# Altium footprint library SparkFun-Retired.PCBLIB: 302 footprints (part 11 of 19)
Each footprint in its own frame and in the unit in brackets; x right, y up, seen from the top. Pads: shape width x height; smd on the part's side, far side on the other; paste and mask are expansions set on the pad; w line width, h text height; cw(c..) or ccw(c..) is an arc to the next point about the centre after c.
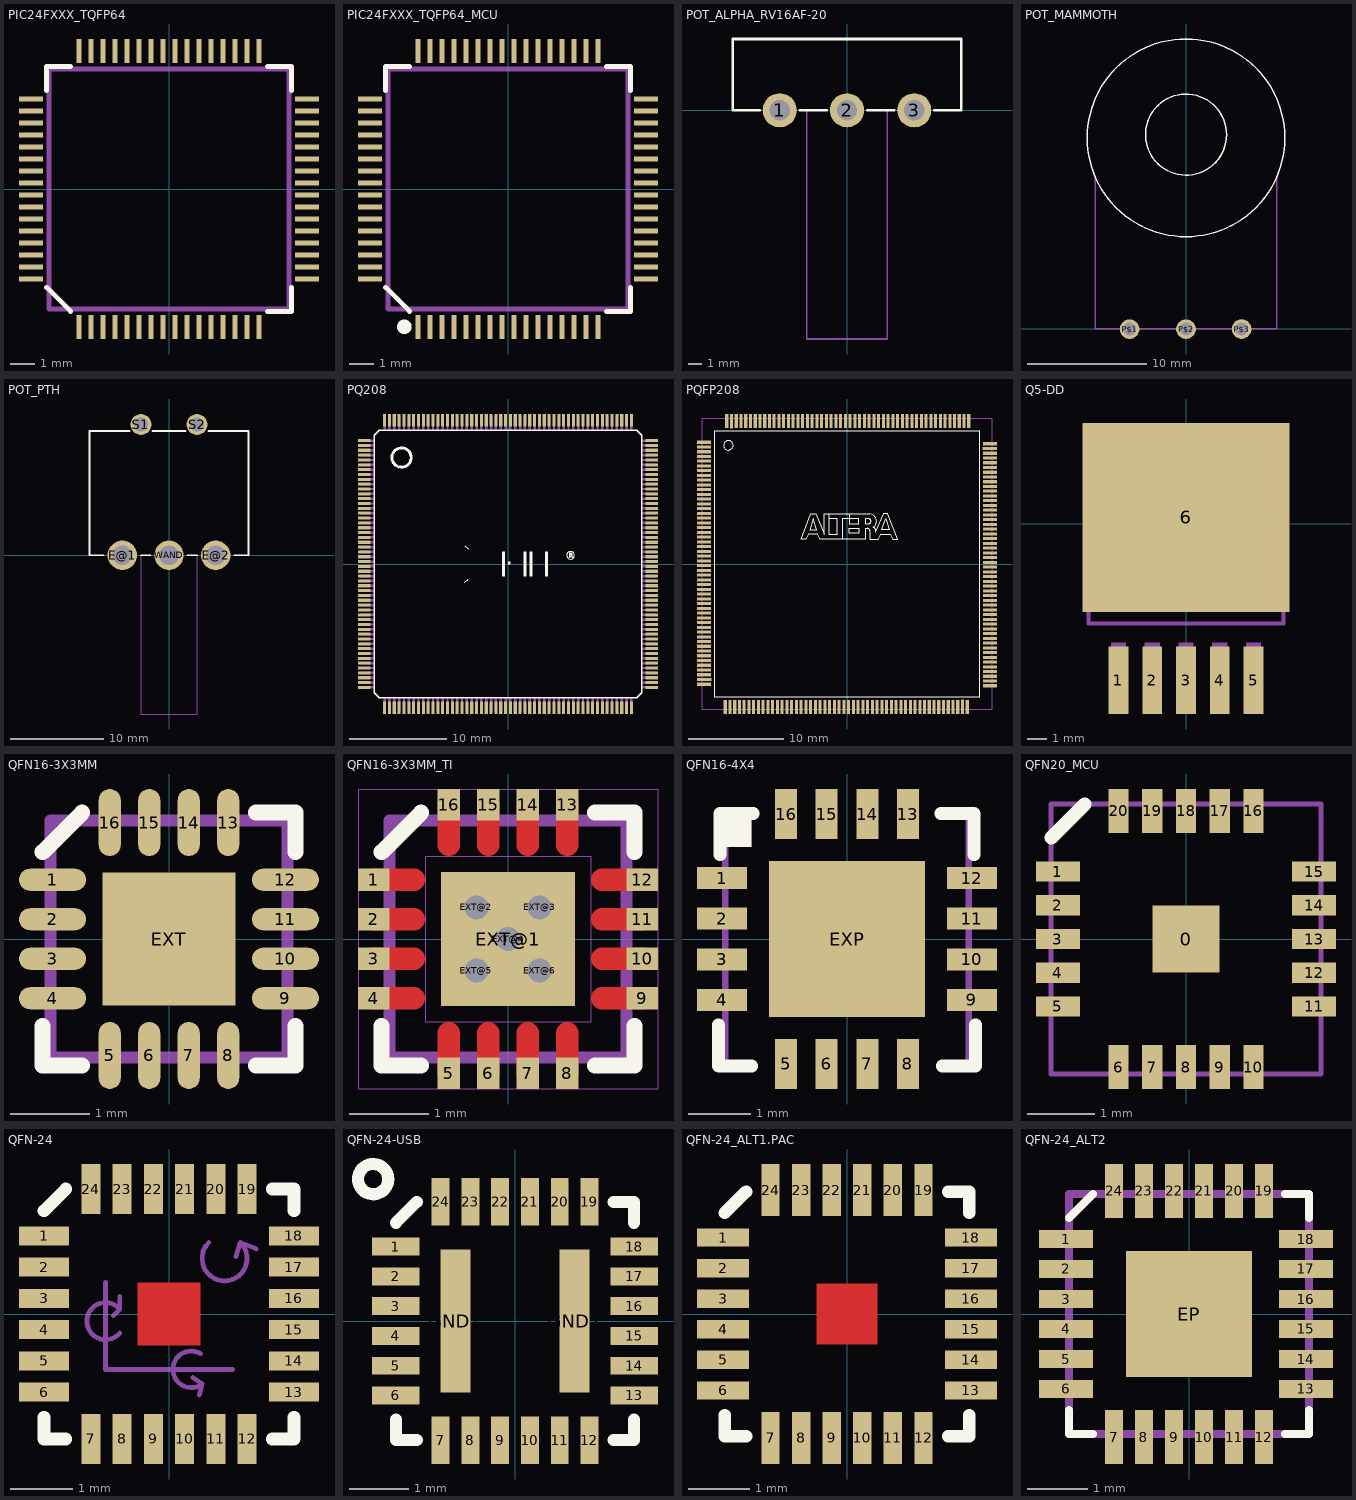
[diagram p10: the footprints below, top view; thin cyan lines are the x and y axes]

## PIC24FXXX_TQFP64 [mm]
pads (64):
  rect 0.22x1 smd: 1(-3.75,-5.75) 2(-3.25,-5.75) 3(-2.75,-5.75) 4(-2.25,-5.75) 5(-1.75,-5.75) 6(-1.25,-5.75) 7(-0.75,-5.75) 8(-0.25,-5.75) 9(0.25,-5.75) 10(0.75,-5.75) 11(1.25,-5.75) 12(1.75,-5.75) 13(2.25,-5.75) 14(2.75,-5.75) 15(3.25,-5.75) 16(3.75,-5.75) 33(3.75,5.75) 34(3.25,5.75) 35(2.75,5.75) 36(2.25,5.75) 37(1.75,5.75) 38(1.25,5.75) 39(0.75,5.75) 40(0.25,5.75) 41(-0.25,5.75) 42(-0.75,5.75) 43(-1.25,5.75) 44(-1.75,5.75) 45(-2.25,5.75) 46(-2.75,5.75) 47(-3.25,5.75) 48(-3.75,5.75)
  rect 1x0.22 smd: 17(5.75,-3.75) 18(5.75,-3.25) 19(5.75,-2.75) 20(5.75,-2.25) 21(5.75,-1.75) 22(5.75,-1.25) 23(5.75,-0.75) 24(5.75,-0.25) 25(5.75,0.25) 26(5.75,0.75) 27(5.75,1.25) 28(5.75,1.75) 29(5.75,2.25) 30(5.75,2.75) 31(5.75,3.25) 32(5.75,3.75) 49(-5.75,3.75) 50(-5.75,3.25) 51(-5.75,2.75) 52(-5.75,2.25) 53(-5.75,1.75) 54(-5.75,1.25) 55(-5.75,0.75) 56(-5.75,0.25) 57(-5.75,-0.25) 58(-5.75,-0.75) 59(-5.75,-1.25) 60(-5.75,-1.75) 61(-5.75,-2.25) 62(-5.75,-2.75) 63(-5.75,-3.25) 64(-5.75,-3.75)
Top Overlay:
  lines w0.203: -5.1,-4.1 -4.1,-5.1 ; -5.1,4.1 -5.1,5.1 -4.1,5.1 ; 4.1,-5.1 5.1,-5.1 5.1,-4.1 ; 4.1,5.1 5.1,5.1 5.1,4.1
Mechanical 16:
  lines w0.203: -5,-5 5,-5 5,5 -5,5 -5,-5

## PIC24FXXX_TQFP64_MCU [mm]
pads (64):
  rect 0.22x1 smd: 1(-3.75,-5.75) 2(-3.25,-5.75) 3(-2.75,-5.75) 4(-2.25,-5.75) 5(-1.75,-5.75) 6(-1.25,-5.75) 7(-0.75,-5.75) 8(-0.25,-5.75) 9(0.25,-5.75) 10(0.75,-5.75) 11(1.25,-5.75) 12(1.75,-5.75) 13(2.25,-5.75) 14(2.75,-5.75) 15(3.25,-5.75) 16(3.75,-5.75) 33(3.75,5.75) 34(3.25,5.75) 35(2.75,5.75) 36(2.25,5.75) 37(1.75,5.75) 38(1.25,5.75) 39(0.75,5.75) 40(0.25,5.75) 41(-0.25,5.75) 42(-0.75,5.75) 43(-1.25,5.75) 44(-1.75,5.75) 45(-2.25,5.75) 46(-2.75,5.75) 47(-3.25,5.75) 48(-3.75,5.75)
  rect 1x0.22 smd: 17(5.75,-3.75) 18(5.75,-3.25) 19(5.75,-2.75) 20(5.75,-2.25) 21(5.75,-1.75) 22(5.75,-1.25) 23(5.75,-0.75) 24(5.75,-0.25) 25(5.75,0.25) 26(5.75,0.75) 27(5.75,1.25) 28(5.75,1.75) 29(5.75,2.25) 30(5.75,2.75) 31(5.75,3.25) 32(5.75,3.75) 49(-5.75,3.75) 50(-5.75,3.25) 51(-5.75,2.75) 52(-5.75,2.25) 53(-5.75,1.75) 54(-5.75,1.25) 55(-5.75,0.75) 56(-5.75,0.25) 57(-5.75,-0.25) 58(-5.75,-0.75) 59(-5.75,-1.25) 60(-5.75,-1.75) 61(-5.75,-2.25) 62(-5.75,-2.75) 63(-5.75,-3.25) 64(-5.75,-3.75)
Top Overlay:
  circle w0.406: c-4.318,-5.74 r0.102
  lines w0.203: -5.1,-4.1 -4.1,-5.1 ; -5.1,4.1 -5.1,5.1 -4.1,5.1 ; 4.1,-5.1 5.1,-5.1 5.1,-4.1 ; 4.1,5.1 5.1,5.1 5.1,4.1
Mechanical 16:
  lines w0.203: -5,-5 5,-5 5,5 -5,5 -5,-5

## POT_ALPHA_RV16AF-20 [mm]
pads (3):
  round 2.54 hole 1.5: 1(-5,0) 2(0,0) 3(5,0)
Top Overlay:
  lines w0.203: -6.5,0 -8.5,0 -8.5,5.3 8.5,5.3 8.5,0 6.5,0 ; -3.5,0 -1.5,0 ; 1.5,0 3.5,0
Mechanical 16:
  lines w0.127: -3,0 -3,-17 3,-17 3,0

## POT_MAMMOTH [mm]
pads (3):
  round 1.65 hole 1.1: P$1(-4.73,-0.02) P$2(0,-0.02) P$3(4.67,-0.01)
Top Overlay:
  circle w0.127: c0,16.03 r8.293
  circle w0.127: c0,16.3 r3.4
Mechanical 16:
  lines w0.127: -7.62,0 0,0 7.62,0 ; -7.62,0.03 -7.62,12.75 ; 7.62,0.03 7.62,12.75

## POT_PTH [mm]
pads (5):
  round 3.15 hole 2.1: E@1(-5,0) E@2(5,0) WAND(0,0)
  round 2.25 hole 1.5: S1(-3,14) S2(3,14)
Top Overlay:
  lines w0.203: -7,0 -8.5,0 -8.5,13.3 -4.25,13.3 ; -3,0 -2,0 ; -1.75,13.3 1.75,13.3 ; 2,0 3,0 ; 4.25,13.3 8.5,13.3 8.5,0 7,0
Mechanical 16:
  lines w0.127: -3,0 -3,-17 3,-17 3,0

## PQ208 [mil]
pads (208):
  rect 51.18x12.6 smd: 1(-584.65,501.97) 2(-584.65,482.28) 3(-584.65,462.6) 4(-584.65,442.91) 5(-584.65,423.23) 6(-584.65,403.54) 7(-584.65,383.86) 8(-584.65,364.17) 9(-584.65,344.49) 10(-584.65,324.8) 11(-584.65,305.12) 12(-584.65,285.43) 13(-584.65,265.75) 14(-584.65,246.06) 15(-584.65,226.38) 16(-584.65,206.69) 17(-584.65,187.01) 18(-584.65,167.32) 19(-584.65,147.64) 20(-584.65,127.95) 21(-584.65,108.27) 22(-584.65,88.58) 23(-584.65,68.9) 24(-584.65,49.21) 25(-584.65,29.53) 26(-584.65,9.84) 27(-584.65,-9.84) 28(-584.65,-29.53) 29(-584.65,-49.21) 30(-584.65,-68.9) 31(-584.65,-88.58) 32(-584.65,-108.27) 33(-584.65,-127.95) 34(-584.65,-147.64) 35(-584.65,-167.32) 36(-584.65,-187.01) 37(-584.65,-206.69) 38(-584.65,-226.38) 39(-584.65,-246.06) 40(-584.65,-265.75) 41(-584.65,-285.43) 42(-584.65,-305.12) 43(-584.65,-324.8) 44(-584.65,-344.49) 45(-584.65,-364.17) 46(-584.65,-383.86) 47(-584.65,-403.54) 48(-584.65,-423.23) 49(-584.65,-442.91) 50(-584.65,-462.6) 51(-584.65,-482.28) 52(-584.65,-501.97) 105(584.65,-501.97) 106(584.65,-482.28) 107(584.65,-462.6) 108(584.65,-442.91) 109(584.65,-423.23) 110(584.65,-403.54) 111(584.65,-383.86) 112(584.65,-364.17) 113(584.65,-344.49) 114(584.65,-324.8) 115(584.65,-305.12) 116(584.65,-285.43) 117(584.65,-265.75) 118(584.65,-246.06) 119(584.65,-226.38) 120(584.65,-206.69) 121(584.65,-187.01) 122(584.65,-167.32) 123(584.65,-147.64) 124(584.65,-127.95) 125(584.65,-108.27) 126(584.65,-88.58) 127(584.65,-68.9) 128(584.65,-49.21) 129(584.65,-29.53) 130(584.65,-9.84) 131(584.65,9.84) 132(584.65,29.53) 133(584.65,49.21) 134(584.65,68.9) 135(584.65,88.58) 136(584.65,108.27) 137(584.65,127.95) 138(584.65,147.64) 139(584.65,167.32) 140(584.65,187.01) 141(584.65,206.69) 142(584.65,226.38) 143(584.65,246.06) 144(584.65,265.75) 145(584.65,285.43) 146(584.65,305.12) 147(584.65,324.8) 148(584.65,344.49) 149(584.65,364.17) 150(584.65,383.86) 151(584.65,403.54) 152(584.65,423.23) 153(584.65,442.91) 154(584.65,462.6) 155(584.65,482.28) 156(584.65,501.97)
  rect 12.6x51.18 smd: 53(-501.97,-584.65) 54(-482.28,-584.65) 55(-462.6,-584.65) 56(-442.91,-584.65) 57(-423.23,-584.65) 58(-403.54,-584.65) 59(-383.86,-584.65) 60(-364.17,-584.65) 61(-344.49,-584.65) 62(-324.8,-584.65) 63(-305.12,-584.65) 64(-285.43,-584.65) 65(-265.75,-584.65) 66(-246.06,-584.65) 67(-226.38,-584.65) 68(-206.69,-584.65) 69(-187.01,-584.65) 70(-167.32,-584.65) 71(-147.64,-584.65) 72(-127.95,-584.65) 73(-108.27,-584.65) 74(-88.58,-584.65) 75(-68.9,-584.65) 76(-49.21,-584.65) 77(-29.53,-584.65) 78(-9.84,-584.65) 79(9.84,-584.65) 80(29.53,-584.65) 81(49.21,-584.65) 82(68.9,-584.65) 83(88.58,-584.65) 84(108.27,-584.65) 85(127.95,-584.65) 86(147.64,-584.65) 87(167.32,-584.65) 88(187.01,-584.65) 89(206.69,-584.65) 90(226.38,-584.65) 91(246.06,-584.65) 92(265.75,-584.65) 93(285.43,-584.65) 94(305.12,-584.65) 95(324.8,-584.65) 96(344.49,-584.65) 97(364.17,-584.65) 98(383.86,-584.65) 99(403.54,-584.65) 100(423.23,-584.65) 101(442.91,-584.65) 102(462.6,-584.65) 103(482.28,-584.65) 104(501.97,-584.65) 157(501.97,584.65) 158(482.28,584.65) 159(462.6,584.65) 160(442.91,584.65) 161(423.23,584.65) 162(403.54,584.65) 163(383.86,584.65) 164(364.17,584.65) 165(344.49,584.65) 166(324.8,584.65) 167(305.12,584.65) 168(285.43,584.65) 169(265.75,584.65) 170(246.06,584.65) 171(226.38,584.65) 172(206.69,584.65) 173(187.01,584.65) 174(167.32,584.65) 175(147.64,584.65) 176(127.95,584.65) 177(108.27,584.65) 178(88.58,584.65) 179(68.9,584.65) 180(49.21,584.65) 181(29.53,584.65) 182(9.84,584.65) 183(-9.84,584.65) 184(-29.53,584.65) 185(-49.21,584.65) 186(-68.9,584.65) 187(-88.58,584.65) 188(-108.27,584.65) 189(-127.95,584.65) 190(-147.64,584.65) 191(-167.32,584.65) 192(-187.01,584.65) 193(-206.69,584.65) 194(-226.38,584.65) 195(-246.06,584.65) 196(-265.75,584.65) 197(-285.43,584.65) 198(-305.12,584.65) 199(-324.8,584.65) 200(-344.49,584.65) 201(-364.17,584.65) 202(-383.86,584.65) 203(-403.54,584.65) 204(-423.23,584.65) 205(-442.91,584.65) 206(-462.6,584.65) 207(-482.28,584.65) 208(-501.97,584.65)
Top Overlay:
  circle w12: c-433.07,433.07 r39.37
  circle w3.94: c254.59,35.3 r15.53
  rectangle: -25,-50 -12.5,50
  rectangle: 62.5,-50 75,50
  rectangle: 87.5,-50 100,50
  rectangle: 150,-50 162.5,50
  rectangle: 249,27 252,44
  rectangle: 251,42 258,44
  rectangle: 251,34 259,37
  region: 0,0 10,0 10,10 0,10
  region: 0,0 10,0 10,10 0,10
  region: 0,0 10,0 10,10 0,10
  region: 0,0 10,0 10,10 0,10
  region: 0,0 10,0 10,10 0,10
  region: 0,0 10,0 10,10 0,10
  region: 0,0 10,0 10,10 0,10
  region: 0,0 10,0 10,10 0,10
  region: 0,0 10,0 10,10 0,10
  region: 0,0 10,0 10,10 0,10
  lines w1.27: 256.11,37.06 ccw(c256.05,39.42) 255.99,41.78 252.43,41.78 252.43,37.08 256.11,37.08 ; 261.57,33.02 262.72,27.3 258.65,27.3 257.89,32.63 ccw(c256.25,32.5) 256.37,34.16 252.43,34.28 252.43,27.3 248.75,27.3 248.75,44.57 256.75,44.57 cw(c256.81,40.02) 258.53,35.8 cw(c258.18,32.37) 261.58,33.02
  lines w2.5: -175,-75 -162.5,-62.5 ; -175,75 -162.5,62.5
  lines w6: 544.09,520.87 544.09,514.96 ; 544.09,514.96 544.09,-524.41 524.41,-544.09 -524.41,-544.09 -544.09,-524.41 -544.09,524.41 -524.41,544.09 524.41,544.09 544.09,524.41 544.09,514.96
Top Paste:
  drawing of 208 lines, arcs and shapes, not listed
Mechanical 16:
  drawing of 208 lines, arcs and shapes, not listed

## PQFP208 [mm]
pads (208):
  rect 1.5x0.33 smd: 1(-15.05,12.83) 2(-15.05,12.33) 3(-15.05,11.83) 4(-15.05,11.33) 5(-15.05,10.83) 6(-15.05,10.33) 7(-15.05,9.83) 8(-15.05,9.33) 9(-15.05,8.83) 10(-15.05,8.33) 11(-15.05,7.83) 12(-15.05,7.33) 13(-15.05,6.83) 14(-15.05,6.33) 15(-15.05,5.83) 16(-15.05,5.33) 17(-15.05,4.83) 18(-15.05,4.33) 19(-15.05,3.83) 20(-15.05,3.33) 21(-15.05,2.83) 22(-15.05,2.33) 23(-15.05,1.83) 24(-15.05,1.33) 25(-15.05,0.83) 26(-15.05,0.33) 27(-15.05,-0.17) 28(-15.05,-0.67) 29(-15.05,-1.17) 30(-15.05,-1.67) 31(-15.05,-2.17) 32(-15.05,-2.67) 33(-15.05,-3.17) 34(-15.05,-3.67) 35(-15.05,-4.17) 36(-15.05,-4.67) 37(-15.05,-5.17) 38(-15.05,-5.67) 39(-15.05,-6.17) 40(-15.05,-6.67) 41(-15.05,-7.17) 42(-15.05,-7.67) 43(-15.05,-8.17) 44(-15.05,-8.67) 45(-15.05,-9.17) 46(-15.05,-9.67) 47(-15.05,-10.17) 48(-15.05,-10.67) 49(-15.05,-11.17) 50(-15.05,-11.67) 51(-15.04,-12.17) 52(-15.05,-12.67) 105(15.05,-12.83) 106(15.05,-12.33) 107(15.05,-11.83) 108(15.05,-11.33) 109(15.05,-10.83) 110(15.05,-10.33) 111(15.05,-9.83) 112(15.05,-9.33) 113(15.05,-8.83) 114(15.05,-8.33) 115(15.05,-7.83) 116(15.05,-7.33) 117(15.05,-6.83) 118(15.05,-6.33) 119(15.05,-5.83) 120(15.05,-5.33) 121(15.05,-4.83) 122(15.05,-4.33) 123(15.05,-3.83) 124(15.05,-3.33) 125(15.05,-2.83) 126(15.05,-2.33) 127(15.05,-1.83) 128(15.05,-1.33) 129(15.05,-0.83) 130(15.05,-0.33) 131(15.05,0.17) 132(15.05,0.67) 133(15.05,1.17) 134(15.05,1.67) 135(15.05,2.17) 136(15.05,2.67) 137(15.05,3.17) 138(15.05,3.67) 139(15.05,4.17) 140(15.05,4.67) 141(15.05,5.17) 142(15.05,5.67) 143(15.05,6.17) 144(15.05,6.67) 145(15.05,7.17) 146(15.05,7.67) 147(15.05,8.17) 148(15.05,8.67) 149(15.05,9.17) 150(15.05,9.67) 151(15.05,10.17) 152(15.05,10.67) 153(15.05,11.17) 154(15.05,11.67) 155(15.04,12.17) 156(15.05,12.67)
  rect 0.33x1.5 smd: 53(-12.83,-15.05) 54(-12.33,-15.05) 55(-11.83,-15.05) 56(-11.33,-15.05) 57(-10.83,-15.05) 58(-10.33,-15.05) 59(-9.83,-15.05) 60(-9.33,-15.05) 61(-8.83,-15.05) 62(-8.33,-15.05) 63(-7.83,-15.05) 64(-7.33,-15.05) 65(-6.83,-15.05) 66(-6.33,-15.05) 67(-5.83,-15.05) 68(-5.33,-15.05) 69(-4.83,-15.05) 70(-4.33,-15.05) 71(-3.83,-15.05) 72(-3.33,-15.05) 73(-2.83,-15.05) 74(-2.33,-15.05) 75(-1.83,-15.05) 76(-1.33,-15.05) 77(-0.83,-15.05) 78(-0.33,-15.05) 79(0.17,-15.05) 80(0.67,-15.05) 81(1.17,-15.05) 82(1.67,-15.05) 83(2.17,-15.05) 84(2.67,-15.05) 85(3.17,-15.05) 86(3.67,-15.05) 87(4.17,-15.05) 88(4.67,-15.05) 89(5.17,-15.05) 90(5.67,-15.05) 91(6.17,-15.05) 92(6.67,-15.05) 93(7.17,-15.05) 94(7.67,-15.05) 95(8.17,-15.05) 96(8.67,-15.05) 97(9.17,-15.05) 98(9.67,-15.05) 99(10.17,-15.05) 100(10.67,-15.05) 101(11.17,-15.05) 102(11.67,-15.05) 103(12.17,-15.04) 104(12.67,-15.05) 157(12.83,15.05) 158(12.33,15.05) 159(11.83,15.05) 160(11.33,15.05) 161(10.83,15.05) 162(10.33,15.05) 163(9.83,15.05) 164(9.33,15.05) 165(8.83,15.05) 166(8.33,15.05) 167(7.83,15.05) 168(7.33,15.05) 169(6.83,15.05) 170(6.33,15.05) 171(5.83,15.05) 172(5.33,15.05) 173(4.83,15.05) 174(4.33,15.05) 175(3.83,15.05) 176(3.33,15.05) 177(2.83,15.05) 178(2.33,15.05) 179(1.83,15.05) 180(1.33,15.05) 181(0.83,15.05) 182(0.33,15.05) 183(-0.17,15.05) 184(-0.67,15.05) 185(-1.17,15.05) 186(-1.67,15.05) 187(-2.17,15.05) 188(-2.67,15.05) 189(-3.17,15.05) 190(-3.67,15.05) 191(-4.17,15.05) 192(-4.67,15.05) 193(-5.17,15.05) 194(-5.67,15.05) 195(-6.17,15.05) 196(-6.67,15.05) 197(-7.17,15.05) 198(-7.67,15.05) 199(-8.17,15.05) 200(-8.67,15.05) 201(-9.17,15.05) 202(-9.67,15.05) 203(-10.17,15.05) 204(-10.67,15.05) 205(-11.17,15.05) 206(-11.67,15.05) 207(-12.168,15.049) 208(-12.67,15.05)
Top Overlay:
  circle w0.127: c-12.5,12.5 r0.5
  lines w0.127: -0.389,2.603 1.897,2.603 1.897,3.746 2.151,3.746 cw(c2.151,3.492) 2.405,3.492 2.405,2.603 3.294,2.603 3.548,3.111 4.564,3.111 4.818,2.603 5.326,2.603 4.31,5.27 3.802,5.27 3.04,3.492 ; 2.786,3.872 ccw(c2.342,4.502) 2.405,5.27 0.246,5.27 ; 2.786,3.873 cw(c2.596,3.461) 3.04,3.365 ; -1.913,4.762 -1.913,5.27 ; -1.913,4.762 -1.913,3.111 -1.024,3.111 -1.024,4.762 -1.913,4.762 ; -1.913,5.27 -2.421,5.27 -2.421,3.111 -3.31,5.27 -3.818,5.27 -4.834,2.603 -4.326,2.603 -4.072,3.111 -3.056,3.111 -2.802,2.603 -0.516,2.603 -0.516,4.762 0.246,4.762 ; -1.913,5.27 0.246,5.27 ; 0.246,4.762 0.246,5.27 ; 0.246,4.762 0.246,4.254 1.262,4.254 1.262,4.762 0.246,4.762 ; -14,-14 14,-14 14,14 -14,14 -14,-14 ; -3.945,3.619 -3.564,4.762 -3.183,3.619 -3.945,3.619 ; 0.246,3.238 1.262,3.238 1.262,3.746 0.246,3.746 0.246,3.238 ; 1.897,4.254 1.897,4.762 2.278,4.762 cw(c2.278,4.508) 2.278,4.254 1.897,4.254 ; 3.675,3.619 4.437,3.619 4.056,4.762 3.675,3.619
Top Paste:
  drawing of 208 lines, arcs and shapes, not listed
Mechanical 16:
  lines w0.127: -15.3,-15.3 15.3,-15.3 15.3,15.29 -15.3,15.29 -15.3,-15.3
  text "PQFP208" at -3.5,0.5 h1.97

## Q5-DD [mm]
pads (6):
  rect 1x3.4 smd: 1(-3.4,-7.875) 2(-1.7,-7.875) 3(0,-7.875) 4(1.7,-7.875) 5(3.4,-7.875)
  rect 10.414x9.525 smd: 6(0,0.325)
Mechanical 16:
  circle w0.254: c0,-0.175 r1
  rectangle: -0.381,-8.768 0.381,-5.974
  rectangle: -3.781,-8.768 -3.019,-5.974
  rectangle: -2.081,-8.768 -1.319,-5.974
  rectangle: 1.319,-8.768 2.081,-5.974
  rectangle: 3.019,-8.768 3.781,-5.974
  region: 0,0 0.254,0 0.254,0.254 0,0.254
  lines w0.203: -4.917,-5.014 4.917,-5.014 4.917,3.99 -4.917,3.99 -4.917,-5.014

## QFN16-3X3MM [mil]
pads (17):
  rrect100% 33.46x11.02 smd: 1(-58.07,29.53) 2(-58.07,9.84) 3(-58.07,-9.84) 4(-58.07,-29.53) 9(58.07,-29.53) 10(58.07,-9.84) 11(58.07,9.84) 12(58.07,29.53)
  rrect100% 11.02x33.46 smd: 5(-29.53,-58.07) 6(-9.84,-58.07) 7(9.84,-58.07) 8(29.53,-58.07) 13(29.53,58.07) 14(9.84,58.07) 15(-9.84,58.07) 16(-29.53,58.07)
  rect 66.14x66.14 smd: EXT(0,0)
Top Overlay:
  lines w8: -62.99,-43.31 -62.99,-62.99 -43.31,-62.99 ; -62.99,43.31 -43.31,62.99 ; 43.31,-62.99 62.99,-62.99 62.99,-43.31 ; 43.31,62.99 62.99,62.99 62.99,43.31
Top Paste:
  rectangle: -23.62,5.91 -5.91,23.62
  rectangle: 5.91,5.91 23.62,23.62
  rectangle: 5.91,-23.62 23.62,-5.91
  rectangle: -23.62,-23.62 -5.91,-5.91
  lines w8: -70.87,-29.53 -45.28,-29.53 ; -70.87,-9.84 -45.28,-9.84 ; -70.87,9.84 -45.28,9.84 ; -70.87,29.53 -45.28,29.53 ; -29.53,-70.87 -29.53,-45.28 ; -29.53,45.28 -29.53,70.87 ; -9.84,-70.87 -9.84,-45.28 ; -9.84,45.28 -9.84,70.87 ; 9.84,-70.87 9.84,-45.28 ; 9.84,45.28 9.84,70.87 ; 29.53,-70.87 29.53,-45.28 ; 29.53,45.28 29.53,70.87 ; 45.28,-29.53 70.87,-29.53 ; 45.28,-9.84 70.87,-9.84 ; 45.28,9.84 70.87,9.84 ; 45.28,29.53 70.87,29.53
Mechanical 16:
  lines w6: -59.06,-59.06 -59.06,59.06 59.06,59.06 59.06,-59.06 -59.06,-59.06

## QFN16-3X3MM_TI [mil]
pads (22):
  rect 15.75x11.02 smd: 1(-66.93,29.53) 2(-66.93,9.84) 3(-66.93,-9.84) 4(-66.93,-29.53) 9(66.93,-29.53) 10(66.93,-9.84) 11(66.93,9.84) 12(66.93,29.53)
  rect 11.02x15.75 smd: 5(-29.53,-66.93) 6(-9.84,-66.93) 7(9.84,-66.93) 8(29.53,-66.93) 13(29.53,66.93) 14(9.84,66.93) 15(-9.84,66.93) 16(-29.53,66.93)
  rect 66.93x66.93 smd: EXT@1(0,0)
  oct 17.71x17.71 hole 11.81: EXT@2(-15.75,15.75) EXT@3(15.75,15.75) EXT@4(0,0) EXT@5(-15.75,-15.75) EXT@6(15.75,-15.75)
Top Layer:
  lines w11.02: -66.93,-29.53 -46.85,-29.53 ; -66.93,-9.84 -46.85,-9.84 ; -66.93,9.84 -46.85,9.84 ; -66.93,29.53 -46.85,29.53 ; -29.53,-66.93 -29.53,-46.85 ; -29.53,46.85 -29.53,66.93 ; -9.84,-66.93 -9.84,-46.85 ; -9.84,46.85 -9.84,66.93 ; 9.84,-66.93 9.84,-46.85 ; 9.84,46.85 9.84,66.93 ; 29.53,-66.93 29.53,-46.85 ; 29.53,46.85 29.53,66.93 ; 46.85,-29.53 66.93,-29.53 ; 46.85,-9.84 66.93,-9.84 ; 46.85,9.84 66.93,9.84 ; 46.85,29.53 66.93,29.53
Top Overlay:
  lines w8: -62.99,-43.31 -62.99,-62.99 -43.31,-62.99 ; -62.99,43.31 -43.31,62.99 ; 43.31,-62.99 62.99,-62.99 62.99,-43.31 ; 43.31,62.99 62.99,62.99 62.99,43.31
Top Paste:
  rectangle: 3.94,3.94 31.5,31.5
  rectangle: 3.94,-31.5 31.5,-3.94
  rectangle: -31.5,-31.5 -3.94,-3.94
  rectangle: -31.5,3.94 -3.94,31.5
  region: 0,0 10,0 10,10 0,10
  region: 0,0 10,0 10,10 0,10
  region: 0,0 10,0 10,10 0,10
  region: 0,0 10,0 10,10 0,10
  region: 0,0 10,0 10,10 0,10
  region: 0,0 10,0 10,10 0,10
  region: 0,0 10,0 10,10 0,10
  region: 0,0 10,0 10,10 0,10
  region: 0,0 10,0 10,10 0,10
  region: 0,0 10,0 10,10 0,10
  region: 0,0 10,0 10,10 0,10
  region: 0,0 10,0 10,10 0,10
  region: 0,0 10,0 10,10 0,10
  region: 0,0 10,0 10,10 0,10
  region: 0,0 10,0 10,10 0,10
  region: 0,0 10,0 10,10 0,10
Top Solder:
  rectangle: -36.61,-36.22 35.83,36.22
  region: 0,0 10,0 10,10 0,10
  region: 0,0 10,0 10,10 0,10
  region: 0,0 10,0 10,10 0,10
  region: 0,0 10,0 10,10 0,10
  region: 0,0 10,0 10,10 0,10
  region: 0,0 10,0 10,10 0,10
  region: 0,0 10,0 10,10 0,10
  region: 0,0 10,0 10,10 0,10
  region: 0,0 10,0 10,10 0,10
  region: 0,0 10,0 10,10 0,10
  region: 0,0 10,0 10,10 0,10
  region: 0,0 10,0 10,10 0,10
  region: 0,0 10,0 10,10 0,10
  region: 0,0 10,0 10,10 0,10
  region: 0,0 10,0 10,10 0,10
  region: 0,0 10,0 10,10 0,10
Mechanical 14:
  lines w0: -74.8,-74.8 74.8,-74.8 74.8,74.8 -74.8,74.8 -74.8,-74.8 ; -41.34,-41.34 -41.34,41.34 41.34,41.34 41.34,-41.34 -41.34,-41.34
Mechanical 16:
  lines w6: -59.06,-59.06 -59.06,59.06 59.06,59.06 59.06,-59.06 -59.06,-59.06

## QFN16-4X4 [mm]
pads (17):
  rect 0.8x0.35 smd: 1(-2,0.975) 2(-2,0.325) 3(-2,-0.325) 4(-2,-0.975) 9(2,-0.975) 10(2,-0.325) 11(2,0.325) 12(2,0.975)
  rect 0.35x0.8 smd: 5(-0.975,-2) 6(-0.325,-2) 7(0.325,-2) 8(0.975,-2) 13(0.975,2) 14(0.325,2) 15(-0.325,2) 16(-0.975,2)
  rect 2.5x2.5 smd: EXP(0,0)
Top Overlay:
  rectangle: -1.95,1.475 -1.525,1.925
  lines w0.203: -2.057,-1.372 -2.057,-2.032 -1.524,-2.032 ; -2.032,1.346 -2.032,2.007 -1.499,2.007 ; 1.499,2.007 2.032,2.007 2.032,1.346 ; 1.524,-2.032 2.057,-2.032 2.057,-1.372
Top Paste:
  rectangle: -1,0.2 -0.2,1
  rectangle: 0.2,0.2 1,1
  rectangle: 0.2,-1 1,-0.2
  rectangle: -1,-1 -0.2,-0.2
Top Solder:
  rectangle: -1.3,-1.3 1.3,1.3
Mechanical 16:
  rectangle: -1.95,1.475 -1.525,1.925
  lines w0.102: -1.95,-1.95 -1.95,1.925 ; 1.95,-1.95 1.95,1.925

## QFN20_MCU [mm]
pads (21):
  rect 1x1 smd: 0(0,0)
  rect 0.65x0.3 smd: 1(-1.9,1) 2(-1.9,0.5) 3(-1.9,0) 4(-1.9,-0.5) 5(-1.9,-1) 11(1.9,-1) 12(1.9,-0.5) 13(1.9,0) 14(1.9,0.5) 15(1.9,1)
  rect 0.3x0.65 smd: 6(-1,-1.9) 7(-0.5,-1.9) 8(0,-1.9) 9(0.5,-1.9) 10(1,-1.9) 16(1,1.9) 17(0.5,1.9) 18(0,1.9) 19(-0.5,1.9) 20(-1,1.9)
Top Overlay:
  lines w0.203: -2,1.5 -1.5,2
Top Paste:
  rectangle: -0.25,-0.25 0.25,0.25
  rectangle: -2.095,0.902 -1.613,1.105
  rectangle: -2.095,0.394 -1.613,0.597
  rectangle: -2.095,-0.102 -1.613,0.102
  rectangle: -2.095,-0.597 -1.613,-0.394
  rectangle: -2.095,-1.105 -1.613,-0.902
  rectangle: 1.613,0.902 2.095,1.105
  rectangle: 1.613,0.394 2.095,0.597
  rectangle: 1.613,-0.102 2.095,0.102
  rectangle: 1.613,-0.597 2.095,-0.394
  rectangle: 1.613,-1.105 2.095,-0.902
  region: -0.902,1.613 -0.902,2.095 -1.105,2.095 -1.105,1.613
  region: -0.394,1.613 -0.394,2.095 -0.597,2.095 -0.597,1.613
  region: 0.102,1.613 0.102,2.095 -0.102,2.095 -0.102,1.613
  region: 0.597,1.613 0.597,2.095 0.394,2.095 0.394,1.613
  region: 1.105,1.613 1.105,2.095 0.902,2.095 0.902,1.613
  region: -0.902,-2.095 -0.902,-1.613 -1.105,-1.613 -1.105,-2.095
  region: -0.394,-2.095 -0.394,-1.613 -0.597,-1.613 -0.597,-2.095
  region: 0.102,-2.095 0.102,-1.613 -0.102,-1.613 -0.102,-2.095
  region: 0.597,-2.095 0.597,-1.613 0.394,-1.613 0.394,-2.095
  region: 1.105,-2.095 1.105,-1.613 0.902,-1.613 0.902,-2.095
Mechanical 16:
  lines w0.076: -2,-2 2,-2 2,2 -2,2 -2,-2

## QFN-24 [mil]
pads (24):
  rect 31.5x11.81 smd: 1(-78.74,49.21) 2(-78.74,29.53) 3(-78.74,9.84) 4(-78.74,-9.84) 5(-78.74,-29.53) 6(-78.74,-49.21) 13(78.74,-49.21) 14(78.74,-29.53) 15(78.74,-9.84) 16(78.74,9.84) 17(78.74,29.53) 18(78.74,49.21)
  rect 11.81x31.5 smd: 7(-49.21,-78.74) 8(-29.53,-78.74) 9(-9.84,-78.74) 10(9.84,-78.74) 11(29.53,-78.74) 12(49.21,-78.74) 19(49.21,78.74) 20(29.53,78.74) 21(9.84,78.74) 22(-9.84,78.74) 23(-29.53,78.74) 24(-49.21,78.74)
Top Layer:
  rectangle: -19.69,-19.69 19.69,19.69
Top Overlay:
  lines w8: -78.74,-64.96 -78.74,-78.74 -64.96,-78.74 ; -78.74,64.96 -64.96,78.74 ; 64.96,-78.74 78.74,-78.74 78.74,-64.96 ; 64.96,78.74 78.74,78.74 78.74,64.96
Top Solder:
  rectangle: -19.69,-19.69 19.69,19.69
Mechanical 16:
  lines w3: -40,20 -40,-35 40,-35 ; -35,-1 -31,3 ; -31,-12 cw(c-40,-4.5) -31,3 ; -31,11 -31,3 ; 15,-40 21,-44 ; 19,-51 21,-44 ; 20,-25 ccw(c14,-34.84) 21,-44 ; 25,45 ccw(c35,35) 45,45 ; 42,36 45,45 ; 55,41 45,45
  text "X" at 44,-47 h24.8
  text "Y" at -48,26 h24.8
  text "Z" at 0,34 h24.8

## QFN-24-USB [mm]
pads (26):
  rect 0.8x0.3 smd: 1(-2,1.25) 2(-2,0.75) 3(-2,0.25) 4(-2,-0.25) 5(-2,-0.75) 6(-2,-1.25) 13(2,-1.25) 14(2,-0.75) 15(2,-0.25) 16(2,0.25) 17(2,0.75) 18(2,1.25)
  rect 0.3x0.8 smd: 7(-1.25,-2) 8(-0.75,-2) 9(-0.25,-2) 10(0.25,-2) 11(0.75,-2) 12(1.25,-2) 19(1.25,2) 20(0.75,2) 21(0.25,2) 22(-0.25,2) 23(-0.75,2) 24(-1.25,2)
  rect 0.5x2.4 smd: GND1(-1,0) GND2(1,0)
Top Overlay:
  circle w0.203: c-2.381,2.381 r0.254
  lines w0.203: -2,-1.65 -2,-2 -1.65,-2 ; -2,1.65 -1.65,2 ; 1.65,-2 2,-2 2,-1.65 ; 1.65,2 2,2 2,1.65

## QFN-24_ALT1.PAC [mil]
pads (24):
  rect 33.5x11.81 smd: 1(-79.74,49.21) 2(-79.74,29.53) 3(-79.74,9.84) 4(-79.74,-9.84) 5(-79.74,-29.53) 6(-79.74,-49.21) 13(79.74,-49.21) 14(79.74,-29.53) 15(79.74,-9.84) 16(79.74,9.84) 17(79.74,29.53) 18(79.74,49.21)
  rect 11.81x33.5 smd: 7(-49.21,-79.74) 8(-29.53,-79.74) 9(-9.84,-79.74) 10(9.84,-79.74) 11(29.53,-79.74) 12(49.21,-79.74) 19(49.21,79.74) 20(29.53,79.74) 21(9.84,79.74) 22(-9.84,79.74) 23(-29.53,79.74) 24(-49.21,79.74)
Top Layer:
  rectangle: -19.69,-19.69 19.69,19.69
Top Overlay:
  lines w8: -78.74,-64.96 -78.74,-78.74 -64.96,-78.74 ; -78.74,64.96 -64.96,78.74 ; 64.96,-78.74 78.74,-78.74 78.74,-64.96 ; 64.96,78.74 78.74,78.74 78.74,64.96
Top Paste:
  rectangle: -7,-7 7,7
  rectangle: -96.51,43.33 -66.25,55.15
  rectangle: -96.46,23.64 -66.2,35.46
  rectangle: -96.46,3.94 -66.2,15.76
  rectangle: -96.47,-15.73 -66.21,-3.91
  rectangle: -96.45,-35.46 -66.19,-23.64
  rectangle: -96.51,-55.06 -66.25,-43.24
  region: 96.46,-43.32 66.2,-43.32 66.2,-55.14 96.46,-55.14
  region: 96.41,-23.63 66.15,-23.63 66.15,-35.45 96.41,-35.45
  region: 96.41,-3.93 66.15,-3.93 66.15,-15.75 96.41,-15.75
  region: 96.42,15.74 66.16,15.74 66.16,3.92 96.42,3.92
  region: 96.4,35.47 66.14,35.47 66.14,23.65 96.4,23.65
  region: 96.46,55.07 66.2,55.07 66.2,43.25 96.46,43.25
  region: 43.27,-66.21 43.27,-96.47 55.09,-96.47 55.09,-66.21
  region: 23.58,-66.26 23.58,-96.52 35.4,-96.52 35.4,-66.26
  region: 3.88,-66.26 3.88,-96.52 15.7,-96.52 15.7,-66.26
  region: -15.79,-66.25 -15.79,-96.51 -3.97,-96.51 -3.97,-66.25
  region: -35.52,-66.27 -35.52,-96.53 -23.7,-96.53 -23.7,-66.27
  region: -55.12,-66.21 -55.12,-96.47 -43.3,-96.47 -43.3,-66.21
  region: -43.27,66.21 -43.27,96.47 -55.07,96.47 -55.07,66.21
  region: -23.57,66.26 -23.57,96.52 -35.39,96.52 -35.39,66.26
  region: -3.87,66.26 -3.87,96.52 -15.69,96.52 -15.69,66.26
  region: 15.8,66.24 15.8,96.5 3.98,96.5 3.98,66.24
  region: 35.53,66.26 35.53,96.52 23.71,96.52 23.71,66.26
  region: 55.12,66.21 55.12,96.47 43.32,96.47 43.32,66.21
Top Solder:
  rectangle: -19.69,-19.69 19.69,19.69

## QFN-24_ALT2 [mil]
pads (25):
  rect 35.43x11.81 smd: 1(-80.71,49.21) 2(-80.71,29.53) 3(-80.71,9.84) 4(-80.71,-9.84) 5(-80.71,-29.53) 6(-80.71,-49.21) 13(76.77,-49.21) 14(76.77,-29.53) 15(76.77,-9.84) 16(76.77,9.84) 17(76.77,29.53) 18(76.77,49.21)
  rect 11.81x35.43 smd: 7(-49.21,-80.71) 8(-29.53,-80.71) 9(-9.84,-80.71) 10(9.84,-80.71) 11(29.53,-80.71) 12(49.21,-80.71) 19(49.21,80.71) 20(29.53,80.71) 21(9.84,80.71) 22(-9.84,80.71) 23(-29.53,80.71) 24(-49.21,80.71)
  rect 82.68x82.68 smd: EP(0,0)
Top Overlay:
  lines w5: -78.74,-62.99 -78.74,-78.74 -62.99,-78.74 ; -78.74,62.99 -62.99,78.74 ; 62.99,-78.74 78.74,-78.74 78.74,-62.99 ; 62.99,78.74 78.74,78.74 78.74,62.99
Mechanical 16:
  lines w5: -78.74,-78.74 -78.74,78.74 78.74,78.74 78.74,-78.74 -78.74,-78.74